# Altium footprint library PcbLib1.PcbLib: 1016 footprints (part 53 of 64)
Each footprint in its own frame and in the unit in brackets; x right, y up, seen from the top. Pads: shape width x height; smd on the part's side, far side on the other; paste and mask are expansions set on the pad; w line width, h text height; cw(c..) or ccw(c..) is an arc to the next point about the centre after c.
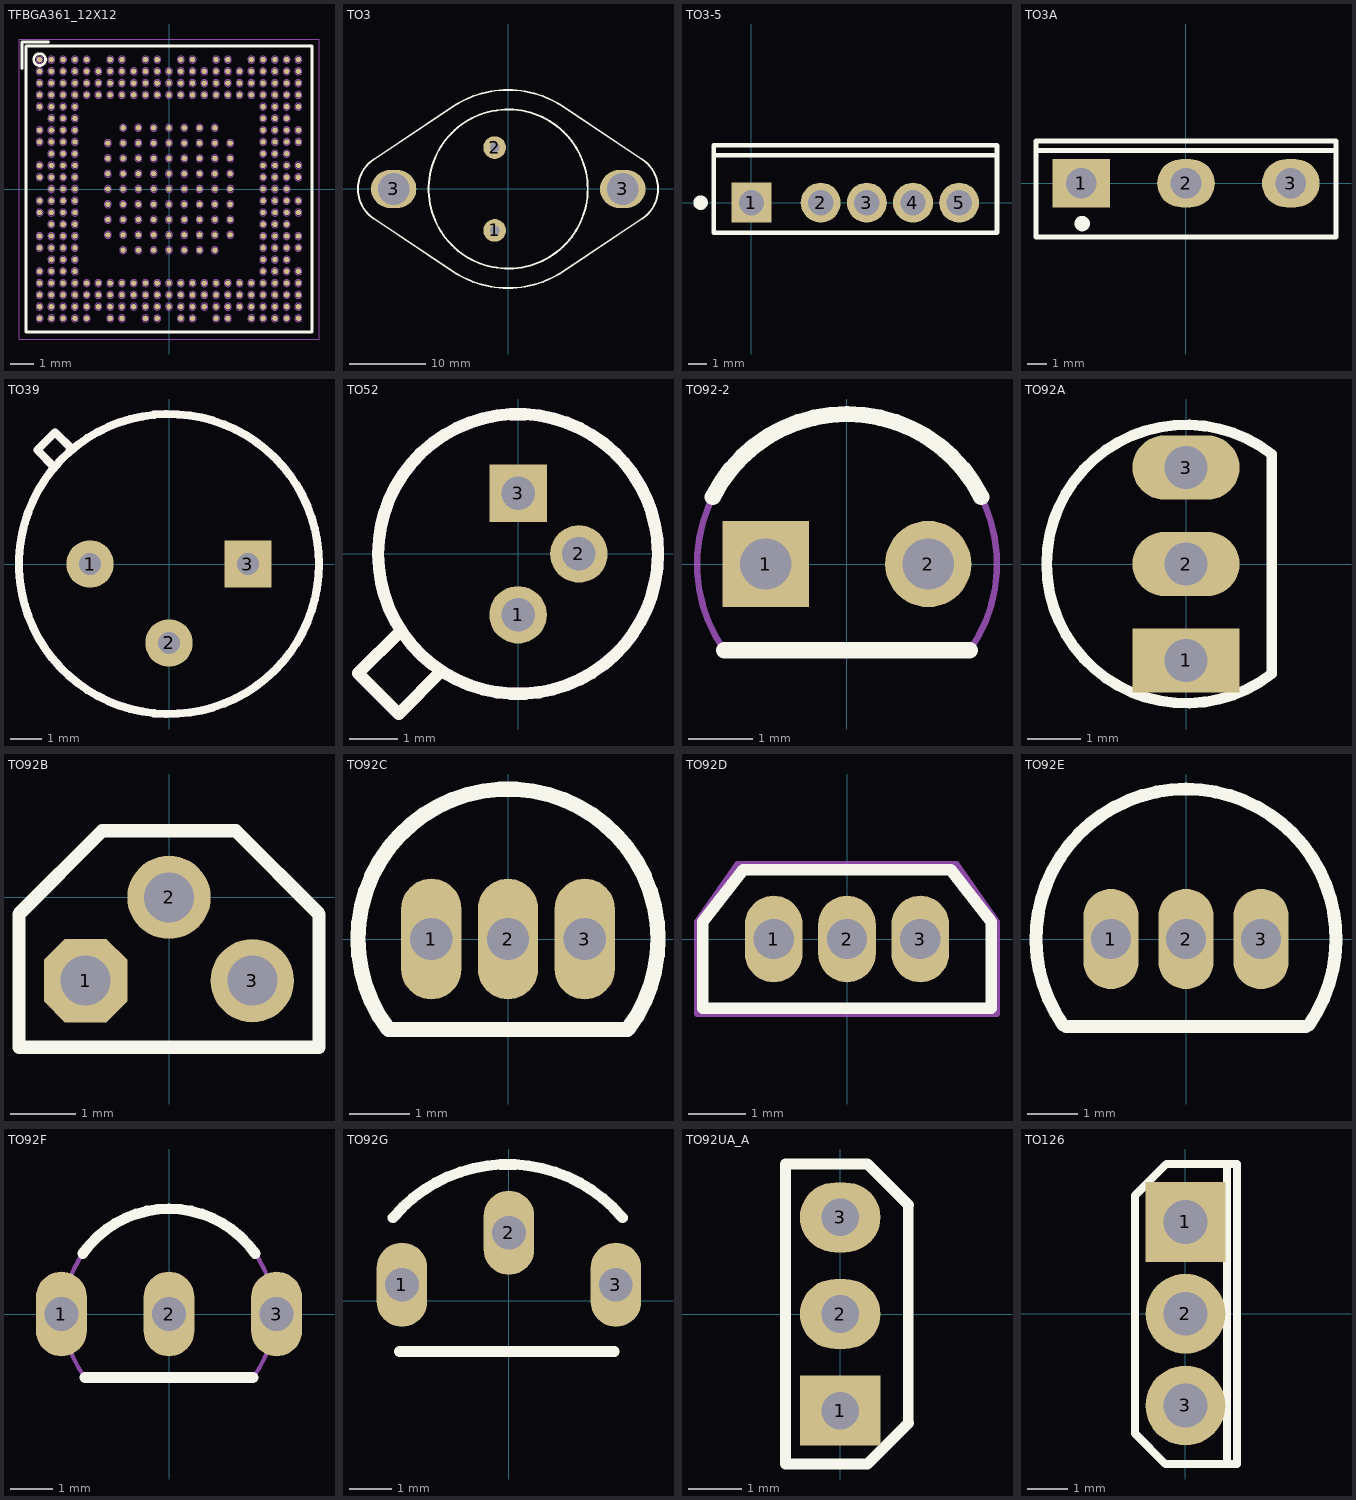
[diagram p52: the footprints below, top view; thin cyan lines are the x and y axes]

## TFBGA361_12X12 [mm]
pads (361):
  round 0.23 smd mask+0.05: 1A2(-1.95,2.6) 1A3(-1.3,2.6) 1A4(-0.65,2.6) 1A5(0,2.6) 1A6(0.65,2.6) 1A7(1.3,2.6) 1A8(1.95,2.6) 1B1(-2.6,1.95) 1B2(-1.95,1.95) 1B3(-1.3,1.95) 1B4(-0.65,1.95) 1B5(0,1.95) 1B6(0.65,1.95) 1B7(1.3,1.95) 1B8(1.95,1.95) 1B9(2.6,1.95) 1C1(-2.6,1.3) 1C2(-1.95,1.3) 1C3(-1.3,1.3) 1C4(-0.65,1.3) 1C5(0,1.3) 1C6(0.65,1.3) 1C7(1.3,1.3) 1C8(1.95,1.3) 1C9(2.6,1.3) 1D1(-2.6,0.65) 1D2(-1.95,0.65) 1D3(-1.3,0.65) 1D4(-0.65,0.65) 1D5(0,0.65) 1D6(0.65,0.65) 1D7(1.3,0.65) 1D8(1.95,0.65) 1D9(2.6,0.65) 1E1(-2.6,0) 1E2(-1.95,0) 1E3(-1.3,0) 1E4(-0.65,0) 1E5(0,0) 1E6(0.65,0) 1E7(1.3,0) 1E8(1.95,0) 1E9(2.6,0) 1F1(-2.6,-0.65) 1F2(-1.95,-0.65) 1F3(-1.3,-0.65) 1F4(-0.65,-0.65) 1F5(0,-0.65) 1F6(0.65,-0.65) 1F7(1.3,-0.65) 1F8(1.95,-0.65) 1F9(2.6,-0.65) 1G1(-2.6,-1.3) 1G2(-1.95,-1.3) 1G3(-1.3,-1.3) 1G4(-0.65,-1.3) 1G5(0,-1.3) 1G6(0.65,-1.3) 1G7(1.3,-1.3) 1G8(1.95,-1.3) 1G9(2.6,-1.3) 1H1(-2.6,-1.95) 1H2(-1.95,-1.95) 1H3(-1.3,-1.95) 1H4(-0.65,-1.95) 1H5(0,-1.95) 1H6(0.65,-1.95) 1H7(1.3,-1.95) 1H8(1.95,-1.95) 1H9(2.6,-1.95) 1J2(-1.95,-2.6) 1J3(-1.3,-2.6) 1J4(-0.65,-2.6) 1J5(0,-2.6) 1J6(0.65,-2.6) 1J7(1.3,-2.6) 1J8(1.95,-2.6) A1(-5.5,5.5) A2(-5,5.5) A3(-4.5,5.5) A4(-4,5.5) A5(-3.5,5.5) A7(-2.5,5.5) A8(-2,5.5) A10(-1,5.5) A11(-0.5,5.5) A13(0.5,5.5) A14(1,5.5) A16(2,5.5) A17(2.5,5.5) A19(3.5,5.5) A20(4,5.5) A21(4.5,5.5) A22(5,5.5) A23(5.5,5.5) AA1(-5.5,-4.5) AA2(-5,-4.5) AA3(-4.5,-4.5) AA4(-4,-4.5) AA5(-3.5,-4.5) AA6(-3,-4.5) AA7(-2.5,-4.5) AA8(-2,-4.5) AA9(-1.5,-4.5) AA10(-1,-4.5) AA11(-0.5,-4.5) AA12(0,-4.5) AA13(0.5,-4.5) AA14(1,-4.5) AA15(1.5,-4.5) AA16(2,-4.5) AA17(2.5,-4.5) AA18(3,-4.5) AA19(3.5,-4.5) AA20(4,-4.5) AA21(4.5,-4.5) AA22(5,-4.5) AA23(5.5,-4.5) AB1(-5.5,-5) AB2(-5,-5) AB3(-4.5,-5) AB4(-4,-5) AB5(-3.5,-5) AB6(-3,-5) AB7(-2.5,-5) AB8(-2,-5) AB9(-1.5,-5) AB10(-1,-5) AB11(-0.5,-5) AB12(0,-5) AB13(0.5,-5) AB14(1,-5) AB15(1.5,-5) AB16(2,-5) AB17(2.5,-5) AB18(3,-5) AB19(3.5,-5) AB20(4,-5) AB21(4.5,-5) AB22(5,-5) AB23(5.5,-5) AC1(-5.5,-5.5) AC2(-5,-5.5) AC3(-4.5,-5.5) AC4(-4,-5.5) AC5(-3.5,-5.5) AC7(-2.5,-5.5) AC8(-2,-5.5) AC10(-1,-5.5) AC11(-0.5,-5.5) AC13(0.5,-5.5) AC14(1,-5.5) AC16(2,-5.5) AC17(2.5,-5.5) AC19(3.5,-5.5) AC20(4,-5.5) AC21(4.5,-5.5) AC22(5,-5.5) AC23(5.5,-5.5) B1(-5.5,5) B2(-5,5) B3(-4.5,5) B4(-4,5) B5(-3.5,5) B6(-3,5) B7(-2.5,5) B8(-2,5) B9(-1.5,5) B10(-1,5) B11(-0.5,5) B12(0,5) B13(0.5,5) B14(1,5) B15(1.5,5) B16(2,5) B17(2.5,5) B18(3,5) B19(3.5,5) B20(4,5) B21(4.5,5) B22(5,5) B23(5.5,5) C1(-5.5,4.5) C2(-5,4.5) C3(-4.5,4.5) C4(-4,4.5) C5(-3.5,4.5) C6(-3,4.5) C7(-2.5,4.5) C8(-2,4.5) C9(-1.5,4.5) C10(-1,4.5) C11(-0.5,4.5) C12(0,4.5) C13(0.5,4.5) C14(1,4.5) C15(1.5,4.5) C16(2,4.5) C17(2.5,4.5) C18(3,4.5) C19(3.5,4.5) C20(4,4.5) C21(4.5,4.5) C22(5,4.5) C23(5.5,4.5) D1(-5.5,4) D2(-5,4) D3(-4.5,4) D4(-4,4) D5(-3.5,4) D6(-3,4) D7(-2.5,4) D8(-2,4) D9(-1.5,4) D10(-1,4) D11(-0.5,4) D12(0,4) D13(0.5,4) D14(1,4) D15(1.5,4) D16(2,4) D17(2.5,4) D18(3,4) D19(3.5,4) D20(4,4) D21(4.5,4) D22(5,4) D23(5.5,4) E1(-5.5,3.5) E2(-5,3.5) E3(-4.5,3.5) E4(-4,3.5) E20(4,3.5) E21(4.5,3.5) E22(5,3.5) E23(5.5,3.5) F2(-5,3) F3(-4.5,3) F4(-4,3) F20(4,3) F21(4.5,3) F22(5,3) G1(-5.5,2.5) G2(-5,2.5) G3(-4.5,2.5) G4(-4,2.5) G20(4,2.5) G21(4.5,2.5) G22(5,2.5) G23(5.5,2.5) H1(-5.5,2) H2(-5,2) H3(-4.5,2) H4(-4,2) H20(4,2) H21(4.5,2) H22(5,2) H23(5.5,2) J2(-5,1.5) J3(-4.5,1.5) J4(-4,1.5) J20(4,1.5) J21(4.5,1.5) J22(5,1.5) K1(-5.5,1) K2(-5,1) K3(-4.5,1) K4(-4,1) K20(4,1) K21(4.5,1) K22(5,1) K23(5.5,1) L1(-5.5,0.5) L2(-5,0.5) L3(-4.5,0.5) L4(-4,0.5) L20(4,0.5) L21(4.5,0.5) L22(5,0.5) L23(5.5,0.5) M2(-5,0) M3(-4.5,0) M4(-4,0) M20(4,0) M21(4.5,0) M22(5,0) N1(-5.5,-0.5) N2(-5,-0.5) N3(-4.5,-0.5) N4(-4,-0.5) N20(4,-0.5) N21(4.5,-0.5) N22(5,-0.5) N23(5.5,-0.5) P1(-5.5,-1) P2(-5,-1) P3(-4.5,-1) P4(-4,-1) P20(4,-1) P21(4.5,-1) P22(5,-1) P23(5.5,-1) R2(-5,-1.5) R3(-4.5,-1.5) R4(-4,-1.5) R20(4,-1.5) R21(4.5,-1.5) R22(5,-1.5) T1(-5.5,-2) T2(-5,-2) T3(-4.5,-2) T4(-4,-2) T20(4,-2) T21(4.5,-2) T22(5,-2) T23(5.5,-2) U1(-5.5,-2.5) U2(-5,-2.5) U3(-4.5,-2.5) U4(-4,-2.5) U20(4,-2.5) U21(4.5,-2.5) U22(5,-2.5) U23(5.5,-2.5) V2(-5,-3) V3(-4.5,-3) V4(-4,-3) V20(4,-3) V21(4.5,-3) V22(5,-3) W1(-5.5,-3.5) W2(-5,-3.5) W3(-4.5,-3.5) W4(-4,-3.5) W20(4,-3.5) W21(4.5,-3.5) W22(5,-3.5) W23(5.5,-3.5) Y1(-5.5,-4) Y2(-5,-4) Y3(-4.5,-4) Y4(-4,-4) Y5(-3.5,-4) Y6(-3,-4) Y7(-2.5,-4) Y8(-2,-4) Y9(-1.5,-4) Y10(-1,-4) Y11(-0.5,-4) Y12(0,-4) Y13(0.5,-4) Y14(1,-4) Y15(1.5,-4) Y16(2,-4) Y17(2.5,-4) Y18(3,-4) Y19(3.5,-4) Y20(4,-4) Y21(4.5,-4) Y22(5,-4) Y23(5.5,-4)
Top Overlay:
  circle w0.12: c-5.5,5.5 r0.251
  lines w0.12: -6.25,5.125 -6.25,6.25 -5.125,6.25 ; -6.075,-6.075 -6.075,6.075 6.075,6.075 6.075,-6.075 -6.075,-6.075
Mechanical 14:
  drawing of 365 lines, arcs and shapes, not listed
  text "A1" at -5.725,5.35 h0.5
Mechanical 16:
  lines w0.01: -6.375,-6.375 6.375,-6.375 6.375,6.375 5.9,6.375 -6.375,6.375 -6.375,-6.375
3D body: height 1.21, standoff 1.2, extent -5.798,5.201 -5.2,5.799
3D body: height 1.2, standoff 0.2, extent -6.075,-6.075 6.075,6.075
3D body: height 0.26, standoff -0.04, extent 3.852,3.359 4.148,3.65
3D body: height 0.26, standoff -0.04, extent 3.852,2.859 4.148,3.15
3D body: height 0.26, standoff -0.04, extent 3.852,2.359 4.148,2.65
3D body: height 0.26, standoff -0.04, extent 3.852,1.859 4.148,2.15
3D body: height 0.26, standoff -0.04, extent 3.852,1.359 4.148,1.65
3D body: height 0.26, standoff -0.04, extent 3.852,0.859 4.148,1.15
3D body: height 0.26, standoff -0.04, extent 3.852,0.359 4.148,0.65
3D body: height 0.26, standoff -0.04, extent 3.852,-0.141 4.148,0.15
3D body: height 0.26, standoff -0.04, extent 3.852,-0.641 4.148,-0.35
3D body: height 0.26, standoff -0.04, extent 3.852,-1.141 4.148,-0.85
3D body: height 0.26, standoff -0.04, extent 3.852,-1.641 4.148,-1.35
3D body: height 0.26, standoff -0.04, extent 3.852,-2.141 4.148,-1.85
3D body: height 0.26, standoff -0.04, extent 3.852,-2.641 4.148,-2.35
3D body: height 0.26, standoff -0.04, extent 3.852,-3.141 4.148,-2.85
3D body: height 0.26, standoff -0.04, extent 3.852,-3.641 4.148,-3.35
3D body: height 0.26, standoff -0.04, extent 4.352,3.359 4.648,3.65
3D body: height 0.26, standoff -0.04, extent 4.352,2.859 4.648,3.15
3D body: height 0.26, standoff -0.04, extent 4.352,2.359 4.648,2.65
3D body: height 0.26, standoff -0.04, extent 4.352,1.859 4.648,2.15
3D body: height 0.26, standoff -0.04, extent 4.352,1.359 4.648,1.65
3D body: height 0.26, standoff -0.04, extent 4.352,0.859 4.648,1.15
3D body: height 0.26, standoff -0.04, extent 4.352,0.359 4.648,0.65
3D body: height 0.26, standoff -0.04, extent 4.352,-0.141 4.648,0.15
3D body: height 0.26, standoff -0.04, extent 4.352,-0.641 4.648,-0.35
3D body: height 0.26, standoff -0.04, extent 4.352,-1.141 4.648,-0.85
3D body: height 0.26, standoff -0.04, extent 4.352,-1.641 4.648,-1.35
3D body: height 0.26, standoff -0.04, extent 4.352,-2.141 4.648,-1.85
3D body: height 0.26, standoff -0.04, extent 4.352,-2.641 4.648,-2.35
3D body: height 0.26, standoff -0.04, extent 4.352,-3.141 4.648,-2.85
3D body: height 0.26, standoff -0.04, extent 4.352,-3.641 4.648,-3.35
3D body: height 0.26, standoff -0.04, extent 4.852,3.359 5.148,3.65
3D body: height 0.26, standoff -0.04, extent 4.852,2.859 5.148,3.15
3D body: height 0.26, standoff -0.04, extent 4.852,2.359 5.148,2.65
3D body: height 0.26, standoff -0.04, extent 4.852,1.859 5.148,2.15
3D body: height 0.26, standoff -0.04, extent 4.852,1.359 5.148,1.65
3D body: height 0.26, standoff -0.04, extent 4.852,0.859 5.148,1.15
3D body: height 0.26, standoff -0.04, extent 4.852,0.359 5.148,0.65
3D body: height 0.26, standoff -0.04, extent 4.852,-0.141 5.148,0.15
3D body: height 0.26, standoff -0.04, extent 4.852,-0.641 5.148,-0.35
3D body: height 0.26, standoff -0.04, extent 4.852,-1.141 5.148,-0.85
3D body: height 0.26, standoff -0.04, extent 4.852,-1.641 5.148,-1.35
3D body: height 0.26, standoff -0.04, extent 4.852,-2.141 5.148,-1.85
3D body: height 0.26, standoff -0.04, extent 4.852,-2.641 5.148,-2.35
3D body: height 0.26, standoff -0.04, extent 4.852,-3.141 5.148,-2.85
3D body: height 0.26, standoff -0.04, extent 4.852,-3.641 5.148,-3.35
3D body: height 0.26, standoff -0.04, extent 5.352,3.359 5.648,3.65
3D body: height 0.26, standoff -0.04, extent 5.352,2.359 5.648,2.65
3D body: height 0.26, standoff -0.04, extent 5.352,1.859 5.648,2.15
3D body: height 0.26, standoff -0.04, extent 5.352,0.859 5.648,1.15
3D body: height 0.26, standoff -0.04, extent 5.352,0.359 5.648,0.65
3D body: height 0.26, standoff -0.04, extent 5.352,-0.641 5.648,-0.35
3D body: height 0.26, standoff -0.04, extent 5.352,-1.141 5.648,-0.85
3D body: height 0.26, standoff -0.04, extent 5.352,-2.141 5.648,-1.85
3D body: height 0.26, standoff -0.04, extent 5.352,-2.641 5.648,-2.35
3D body: height 0.26, standoff -0.04, extent 5.352,-3.641 5.648,-3.35
3D body: height 0.26, standoff -0.04, extent -4.148,3.359 -3.852,3.65
3D body: height 0.26, standoff -0.04, extent -4.148,2.859 -3.852,3.15
3D body: height 0.26, standoff -0.04, extent -4.148,2.359 -3.852,2.65
3D body: height 0.26, standoff -0.04, extent -4.148,1.859 -3.852,2.15
3D body: height 0.26, standoff -0.04, extent -4.148,1.359 -3.852,1.65
3D body: height 0.26, standoff -0.04, extent -4.148,0.859 -3.852,1.15
3D body: height 0.26, standoff -0.04, extent -4.148,0.359 -3.852,0.65
3D body: height 0.26, standoff -0.04, extent -4.148,-0.141 -3.852,0.15
3D body: height 0.26, standoff -0.04, extent -4.148,-0.641 -3.852,-0.35
3D body: height 0.26, standoff -0.04, extent -4.148,-1.141 -3.852,-0.85
3D body: height 0.26, standoff -0.04, extent -4.148,-1.641 -3.852,-1.35
3D body: height 0.26, standoff -0.04, extent -4.148,-2.141 -3.852,-1.85
3D body: height 0.26, standoff -0.04, extent -4.148,-2.641 -3.852,-2.35
3D body: height 0.26, standoff -0.04, extent -4.148,-3.141 -3.852,-2.85
3D body: height 0.26, standoff -0.04, extent -4.148,-3.641 -3.852,-3.35
3D body: height 0.26, standoff -0.04, extent -4.648,3.359 -4.352,3.65
3D body: height 0.26, standoff -0.04, extent -4.648,2.859 -4.352,3.15
3D body: height 0.26, standoff -0.04, extent -4.648,2.359 -4.352,2.65
3D body: height 0.26, standoff -0.04, extent -4.648,1.859 -4.352,2.15
3D body: height 0.26, standoff -0.04, extent -4.648,1.359 -4.352,1.65
3D body: height 0.26, standoff -0.04, extent -4.648,0.859 -4.352,1.15
3D body: height 0.26, standoff -0.04, extent -4.648,0.359 -4.352,0.65
3D body: height 0.26, standoff -0.04, extent -4.648,-0.141 -4.352,0.15
3D body: height 0.26, standoff -0.04, extent -4.648,-0.641 -4.352,-0.35
3D body: height 0.26, standoff -0.04, extent -4.648,-1.141 -4.352,-0.85
3D body: height 0.26, standoff -0.04, extent -4.648,-1.641 -4.352,-1.35
3D body: height 0.26, standoff -0.04, extent -4.648,-2.141 -4.352,-1.85
3D body: height 0.26, standoff -0.04, extent -4.648,-2.641 -4.352,-2.35
3D body: height 0.26, standoff -0.04, extent -4.648,-3.141 -4.352,-2.85
3D body: height 0.26, standoff -0.04, extent -4.648,-3.641 -4.352,-3.35
3D body: height 0.26, standoff -0.04, extent -5.148,3.359 -4.852,3.65
3D body: height 0.26, standoff -0.04, extent -5.148,2.859 -4.852,3.15
3D body: height 0.26, standoff -0.04, extent -5.148,2.359 -4.852,2.65
3D body: height 0.26, standoff -0.04, extent -5.148,1.859 -4.852,2.15
3D body: height 0.26, standoff -0.04, extent -5.148,1.359 -4.852,1.65
3D body: height 0.26, standoff -0.04, extent -5.148,0.859 -4.852,1.15
3D body: height 0.26, standoff -0.04, extent -5.148,0.359 -4.852,0.65
3D body: height 0.26, standoff -0.04, extent -5.148,-0.141 -4.852,0.15
3D body: height 0.26, standoff -0.04, extent -5.148,-0.641 -4.852,-0.35
3D body: height 0.26, standoff -0.04, extent -5.148,-1.141 -4.852,-0.85
3D body: height 0.26, standoff -0.04, extent -5.148,-1.641 -4.852,-1.35
3D body: height 0.26, standoff -0.04, extent -5.148,-2.141 -4.852,-1.85
3D body: height 0.26, standoff -0.04, extent -5.148,-2.641 -4.852,-2.35
3D body: height 0.26, standoff -0.04, extent -5.148,-3.141 -4.852,-2.85
3D body: height 0.26, standoff -0.04, extent -5.148,-3.641 -4.852,-3.35
3D body: height 0.26, standoff -0.04, extent -5.648,-3.641 -5.352,-3.35
3D body: height 0.26, standoff -0.04, extent -5.648,-2.641 -5.352,-2.35
3D body: height 0.26, standoff -0.04, extent -5.648,-2.141 -5.352,-1.85
3D body: height 0.26, standoff -0.04, extent -5.648,-1.141 -5.352,-0.85
3D body: height 0.26, standoff -0.04, extent -5.648,-0.641 -5.352,-0.35
3D body: height 0.26, standoff -0.04, extent -5.648,0.359 -5.352,0.65
3D body: height 0.26, standoff -0.04, extent -5.648,0.859 -5.352,1.15
3D body: height 0.26, standoff -0.04, extent -5.648,1.859 -5.352,2.15
3D body: height 0.26, standoff -0.04, extent -5.648,2.359 -5.352,2.65
3D body: height 0.26, standoff -0.04, extent -5.648,3.359 -5.352,3.65
3D body: height 0.26, standoff -0.04, extent -5.641,-5.648 -5.35,-5.352
3D body: height 0.26, standoff -0.04, extent -5.141,-5.648 -4.85,-5.352
3D body: height 0.26, standoff -0.04, extent -4.641,-5.648 -4.35,-5.352
3D body: height 0.26, standoff -0.04, extent -4.141,-5.648 -3.85,-5.352
3D body: height 0.26, standoff -0.04, extent -3.641,-5.648 -3.35,-5.352
3D body: height 0.26, standoff -0.04, extent -2.641,-5.648 -2.35,-5.352
3D body: height 0.26, standoff -0.04, extent -2.141,-5.648 -1.85,-5.352
3D body: height 0.26, standoff -0.04, extent -1.141,-5.648 -0.85,-5.352
3D body: height 0.26, standoff -0.04, extent -0.641,-5.648 -0.35,-5.352
3D body: height 0.26, standoff -0.04, extent 0.359,-5.648 0.65,-5.352
3D body: height 0.26, standoff -0.04, extent 0.859,-5.648 1.15,-5.352
3D body: height 0.26, standoff -0.04, extent 1.859,-5.648 2.15,-5.352
3D body: height 0.26, standoff -0.04, extent 2.359,-5.648 2.65,-5.352
3D body: height 0.26, standoff -0.04, extent 3.359,-5.648 3.65,-5.352
3D body: height 0.26, standoff -0.04, extent 3.859,-5.648 4.15,-5.352
3D body: height 0.26, standoff -0.04, extent 4.359,-5.648 4.65,-5.352
3D body: height 0.26, standoff -0.04, extent 4.859,-5.648 5.15,-5.352
3D body: height 0.26, standoff -0.04, extent 5.359,-5.648 5.65,-5.352
3D body: height 0.26, standoff -0.04, extent -5.641,-5.148 -5.35,-4.852
3D body: height 0.26, standoff -0.04, extent -5.141,-5.148 -4.85,-4.852
3D body: height 0.26, standoff -0.04, extent -4.641,-5.148 -4.35,-4.852
3D body: height 0.26, standoff -0.04, extent -4.141,-5.148 -3.85,-4.852
3D body: height 0.26, standoff -0.04, extent -3.641,-5.148 -3.35,-4.852
3D body: height 0.26, standoff -0.04, extent -3.141,-5.148 -2.85,-4.852
3D body: height 0.26, standoff -0.04, extent -2.641,-5.148 -2.35,-4.852
3D body: height 0.26, standoff -0.04, extent -2.141,-5.148 -1.85,-4.852
3D body: height 0.26, standoff -0.04, extent -1.641,-5.148 -1.35,-4.852
3D body: height 0.26, standoff -0.04, extent -1.141,-5.148 -0.85,-4.852
3D body: height 0.26, standoff -0.04, extent -0.641,-5.148 -0.35,-4.852
3D body: height 0.26, standoff -0.04, extent -0.141,-5.148 0.15,-4.852
3D body: height 0.26, standoff -0.04, extent 0.359,-5.148 0.65,-4.852
3D body: height 0.26, standoff -0.04, extent 0.859,-5.148 1.15,-4.852
3D body: height 0.26, standoff -0.04, extent 1.359,-5.148 1.65,-4.852
3D body: height 0.26, standoff -0.04, extent 1.859,-5.148 2.15,-4.852
3D body: height 0.26, standoff -0.04, extent 2.359,-5.148 2.65,-4.852
3D body: height 0.26, standoff -0.04, extent 2.859,-5.148 3.15,-4.852
3D body: height 0.26, standoff -0.04, extent 3.359,-5.148 3.65,-4.852
3D body: height 0.26, standoff -0.04, extent 3.859,-5.148 4.15,-4.852
3D body: height 0.26, standoff -0.04, extent 4.359,-5.148 4.65,-4.852
3D body: height 0.26, standoff -0.04, extent 4.859,-5.148 5.15,-4.852
3D body: height 0.26, standoff -0.04, extent 5.359,-5.148 5.65,-4.852
3D body: height 0.26, standoff -0.04, extent -5.641,-4.648 -5.35,-4.352
3D body: height 0.26, standoff -0.04, extent -5.141,-4.648 -4.85,-4.352
3D body: height 0.26, standoff -0.04, extent -4.641,-4.648 -4.35,-4.352
3D body: height 0.26, standoff -0.04, extent -4.141,-4.648 -3.85,-4.352
3D body: height 0.26, standoff -0.04, extent -3.641,-4.648 -3.35,-4.352
3D body: height 0.26, standoff -0.04, extent -3.141,-4.648 -2.85,-4.352
3D body: height 0.26, standoff -0.04, extent -2.641,-4.648 -2.35,-4.352
3D body: height 0.26, standoff -0.04, extent -2.141,-4.648 -1.85,-4.352
3D body: height 0.26, standoff -0.04, extent -1.641,-4.648 -1.35,-4.352
3D body: height 0.26, standoff -0.04, extent -1.141,-4.648 -0.85,-4.352
3D body: height 0.26, standoff -0.04, extent -0.641,-4.648 -0.35,-4.352
3D body: height 0.26, standoff -0.04, extent -0.141,-4.648 0.15,-4.352
3D body: height 0.26, standoff -0.04, extent 0.359,-4.648 0.65,-4.352
3D body: height 0.26, standoff -0.04, extent 0.859,-4.648 1.15,-4.352
3D body: height 0.26, standoff -0.04, extent 1.359,-4.648 1.65,-4.352
3D body: height 0.26, standoff -0.04, extent 1.859,-4.648 2.15,-4.352
3D body: height 0.26, standoff -0.04, extent 2.359,-4.648 2.65,-4.352
3D body: height 0.26, standoff -0.04, extent 2.859,-4.648 3.15,-4.352
3D body: height 0.26, standoff -0.04, extent 3.359,-4.648 3.65,-4.352
3D body: height 0.26, standoff -0.04, extent 3.859,-4.648 4.15,-4.352
3D body: height 0.26, standoff -0.04, extent 4.359,-4.648 4.65,-4.352
3D body: height 0.26, standoff -0.04, extent 4.859,-4.648 5.15,-4.352
3D body: height 0.26, standoff -0.04, extent 5.359,-4.648 5.65,-4.352
3D body: height 0.26, standoff -0.04, extent -5.641,-4.148 -5.35,-3.852
3D body: height 0.26, standoff -0.04, extent -5.141,-4.148 -4.85,-3.852
3D body: height 0.26, standoff -0.04, extent -4.641,-4.148 -4.35,-3.852
3D body: height 0.26, standoff -0.04, extent -4.141,-4.148 -3.85,-3.852
3D body: height 0.26, standoff -0.04, extent -3.641,-4.148 -3.35,-3.852
3D body: height 0.26, standoff -0.04, extent -3.141,-4.148 -2.85,-3.852
3D body: height 0.26, standoff -0.04, extent -2.641,-4.148 -2.35,-3.852
3D body: height 0.26, standoff -0.04, extent -2.141,-4.148 -1.85,-3.852
3D body: height 0.26, standoff -0.04, extent -1.641,-4.148 -1.35,-3.852
3D body: height 0.26, standoff -0.04, extent -1.141,-4.148 -0.85,-3.852
3D body: height 0.26, standoff -0.04, extent -0.641,-4.148 -0.35,-3.852
3D body: height 0.26, standoff -0.04, extent -0.141,-4.148 0.15,-3.852
3D body: height 0.26, standoff -0.04, extent 0.359,-4.148 0.65,-3.852
3D body: height 0.26, standoff -0.04, extent 0.859,-4.148 1.15,-3.852
3D body: height 0.26, standoff -0.04, extent 1.359,-4.148 1.65,-3.852
3D body: height 0.26, standoff -0.04, extent 1.859,-4.148 2.15,-3.852
3D body: height 0.26, standoff -0.04, extent 2.359,-4.148 2.65,-3.852
3D body: height 0.26, standoff -0.04, extent 2.859,-4.148 3.15,-3.852
3D body: height 0.26, standoff -0.04, extent 3.359,-4.148 3.65,-3.852
3D body: height 0.26, standoff -0.04, extent 3.859,-4.148 4.15,-3.852
3D body: height 0.26, standoff -0.04, extent 4.359,-4.148 4.65,-3.852
3D body: height 0.26, standoff -0.04, extent 4.859,-4.148 5.15,-3.852
3D body: height 0.26, standoff -0.04, extent 5.359,-4.148 5.65,-3.852
3D body: height 0.26, standoff -0.04, extent -5.641,3.852 -5.35,4.148
3D body: height 0.26, standoff -0.04, extent -5.141,3.852 -4.85,4.148
3D body: height 0.26, standoff -0.04, extent -4.641,3.852 -4.35,4.148
3D body: height 0.26, standoff -0.04, extent -4.141,3.852 -3.85,4.148
3D body: height 0.26, standoff -0.04, extent -3.641,3.852 -3.35,4.148
3D body: height 0.26, standoff -0.04, extent -3.141,3.852 -2.85,4.148
3D body: height 0.26, standoff -0.04, extent -2.641,3.852 -2.35,4.148
3D body: height 0.26, standoff -0.04, extent -2.141,3.852 -1.85,4.148
3D body: height 0.26, standoff -0.04, extent -1.641,3.852 -1.35,4.148
3D body: height 0.26, standoff -0.04, extent -1.141,3.852 -0.85,4.148
3D body: height 0.26, standoff -0.04, extent -0.641,3.852 -0.35,4.148
3D body: height 0.26, standoff -0.04, extent -0.141,3.852 0.15,4.148
3D body: height 0.26, standoff -0.04, extent 0.359,3.852 0.65,4.148
3D body: height 0.26, standoff -0.04, extent 0.859,3.852 1.15,4.148
3D body: height 0.26, standoff -0.04, extent 1.359,3.852 1.65,4.148
3D body: height 0.26, standoff -0.04, extent 1.859,3.852 2.15,4.148
3D body: height 0.26, standoff -0.04, extent 2.359,3.852 2.65,4.148
3D body: height 0.26, standoff -0.04, extent 2.859,3.852 3.15,4.148
3D body: height 0.26, standoff -0.04, extent 3.359,3.852 3.65,4.148
3D body: height 0.26, standoff -0.04, extent 3.859,3.852 4.15,4.148
3D body: height 0.26, standoff -0.04, extent 4.359,3.852 4.65,4.148
3D body: height 0.26, standoff -0.04, extent 4.859,3.852 5.15,4.148
3D body: height 0.26, standoff -0.04, extent 5.359,3.852 5.65,4.148
3D body: height 0.26, standoff -0.04, extent -5.641,4.352 -5.35,4.648
3D body: height 0.26, standoff -0.04, extent -5.141,4.352 -4.85,4.648
3D body: height 0.26, standoff -0.04, extent -4.641,4.352 -4.35,4.648
3D body: height 0.26, standoff -0.04, extent -4.141,4.352 -3.85,4.648
3D body: height 0.26, standoff -0.04, extent -3.641,4.352 -3.35,4.648
3D body: height 0.26, standoff -0.04, extent -3.141,4.352 -2.85,4.648
3D body: height 0.26, standoff -0.04, extent -2.641,4.352 -2.35,4.648
3D body: height 0.26, standoff -0.04, extent -2.141,4.352 -1.85,4.648
3D body: height 0.26, standoff -0.04, extent -1.641,4.352 -1.35,4.648
3D body: height 0.26, standoff -0.04, extent -1.141,4.352 -0.85,4.648
3D body: height 0.26, standoff -0.04, extent -0.641,4.352 -0.35,4.648
3D body: height 0.26, standoff -0.04, extent -0.141,4.352 0.15,4.648
3D body: height 0.26, standoff -0.04, extent 0.359,4.352 0.65,4.648
3D body: height 0.26, standoff -0.04, extent 0.859,4.352 1.15,4.648
3D body: height 0.26, standoff -0.04, extent 1.359,4.352 1.65,4.648
3D body: height 0.26, standoff -0.04, extent 1.859,4.352 2.15,4.648
3D body: height 0.26, standoff -0.04, extent 2.359,4.352 2.65,4.648
3D body: height 0.26, standoff -0.04, extent 2.859,4.352 3.15,4.648
3D body: height 0.26, standoff -0.04, extent 3.359,4.352 3.65,4.648
3D body: height 0.26, standoff -0.04, extent 3.859,4.352 4.15,4.648
3D body: height 0.26, standoff -0.04, extent 4.359,4.352 4.65,4.648
3D body: height 0.26, standoff -0.04, extent 4.859,4.352 5.15,4.648
3D body: height 0.26, standoff -0.04, extent 5.359,4.352 5.65,4.648
3D body: height 0.26, standoff -0.04, extent -5.641,4.852 -5.35,5.148
3D body: height 0.26, standoff -0.04, extent -5.141,4.852 -4.85,5.148
3D body: height 0.26, standoff -0.04, extent -4.641,4.852 -4.35,5.148
3D body: height 0.26, standoff -0.04, extent -4.141,4.852 -3.85,5.148
3D body: height 0.26, standoff -0.04, extent -3.641,4.852 -3.35,5.148
3D body: height 0.26, standoff -0.04, extent -3.141,4.852 -2.85,5.148
3D body: height 0.26, standoff -0.04, extent -2.641,4.852 -2.35,5.148
3D body: height 0.26, standoff -0.04, extent -2.141,4.852 -1.85,5.148
3D body: height 0.26, standoff -0.04, extent -1.641,4.852 -1.35,5.148
3D body: height 0.26, standoff -0.04, extent -1.141,4.852 -0.85,5.148
3D body: height 0.26, standoff -0.04, extent -0.641,4.852 -0.35,5.148
3D body: height 0.26, standoff -0.04, extent -0.141,4.852 0.15,5.148
3D body: height 0.26, standoff -0.04, extent 0.359,4.852 0.65,5.148
3D body: height 0.26, standoff -0.04, extent 0.859,4.852 1.15,5.148
3D body: height 0.26, standoff -0.04, extent 1.359,4.852 1.65,5.148
3D body: height 0.26, standoff -0.04, extent 1.859,4.852 2.15,5.148
3D body: height 0.26, standoff -0.04, extent 2.359,4.852 2.65,5.148
3D body: height 0.26, standoff -0.04, extent 2.859,4.852 3.15,5.148
3D body: height 0.26, standoff -0.04, extent 3.359,4.852 3.65,5.148
3D body: height 0.26, standoff -0.04, extent 3.859,4.852 4.15,5.148
3D body: height 0.26, standoff -0.04, extent 4.359,4.852 4.65,5.148
3D body: height 0.26, standoff -0.04, extent 4.859,4.852 5.15,5.148
3D body: height 0.26, standoff -0.04, extent 5.359,4.852 5.65,5.148
3D body: height 0.26, standoff -0.04, extent 5.359,5.352 5.65,5.648
3D body: height 0.26, standoff -0.04, extent 4.859,5.352 5.15,5.648
3D body: height 0.26, standoff -0.04, extent 4.359,5.352 4.65,5.648
3D body: height 0.26, standoff -0.04, extent 3.859,5.352 4.15,5.648
3D body: height 0.26, standoff -0.04, extent 3.359,5.352 3.65,5.648
3D body: height 0.26, standoff -0.04, extent 2.359,5.352 2.65,5.648
3D body: height 0.26, standoff -0.04, extent 1.859,5.352 2.15,5.648
3D body: height 0.26, standoff -0.04, extent 0.859,5.352 1.15,5.648
3D body: height 0.26, standoff -0.04, extent 0.359,5.352 0.65,5.648
3D body: height 0.26, standoff -0.04, extent -0.641,5.352 -0.35,5.648
3D body: height 0.26, standoff -0.04, extent -1.141,5.352 -0.85,5.648
3D body: height 0.26, standoff -0.04, extent -2.141,5.352 -1.85,5.648
3D body: height 0.26, standoff -0.04, extent -2.641,5.352 -2.35,5.648
3D body: height 0.26, standoff -0.04, extent -3.641,5.352 -3.35,5.648
3D body: height 0.26, standoff -0.04, extent -4.141,5.352 -3.85,5.648
3D body: height 0.26, standoff -0.04, extent -4.641,5.352 -4.35,5.648
3D body: height 0.26, standoff -0.04, extent -5.141,5.352 -4.85,5.648
3D body: height 0.26, standoff -0.04, extent -5.641,5.352 -5.35,5.648
3D body: height 0.26, standoff -0.04, extent -0.141,-2.748 0.15,-2.452
3D body: height 0.26, standoff -0.04, extent -2.091,-2.748 -1.8,-2.452
3D body: height 0.26, standoff -0.04, extent -1.441,-2.748 -1.15,-2.452
3D body: height 0.26, standoff -0.04, extent -0.791,-2.748 -0.5,-2.452
3D body: height 0.26, standoff -0.04, extent 0.509,-2.748 0.8,-2.452
3D body: height 0.26, standoff -0.04, extent 1.159,-2.748 1.45,-2.452
3D body: height 0.26, standoff -0.04, extent 1.809,-2.748 2.1,-2.452
3D body: height 0.26, standoff -0.04, extent -0.141,-2.098 0.15,-1.802
3D body: height 0.26, standoff -0.04, extent -2.741,-2.098 -2.45,-1.802
3D body: height 0.26, standoff -0.04, extent -2.091,-2.098 -1.8,-1.802
3D body: height 0.26, standoff -0.04, extent -1.441,-2.098 -1.15,-1.802
3D body: height 0.26, standoff -0.04, extent -0.791,-2.098 -0.5,-1.802
3D body: height 0.26, standoff -0.04, extent 0.509,-2.098 0.8,-1.802
3D body: height 0.26, standoff -0.04, extent 1.159,-2.098 1.45,-1.802
3D body: height 0.26, standoff -0.04, extent 1.809,-2.098 2.1,-1.802
3D body: height 0.26, standoff -0.04, extent 2.459,-2.098 2.75,-1.802
3D body: height 0.26, standoff -0.04, extent -0.141,-1.448 0.15,-1.152
3D body: height 0.26, standoff -0.04, extent -2.741,-1.448 -2.45,-1.152
3D body: height 0.26, standoff -0.04, extent -2.091,-1.448 -1.8,-1.152
3D body: height 0.26, standoff -0.04, extent -1.441,-1.448 -1.15,-1.152
3D body: height 0.26, standoff -0.04, extent -0.791,-1.448 -0.5,-1.152
3D body: height 0.26, standoff -0.04, extent 0.509,-1.448 0.8,-1.152
3D body: height 0.26, standoff -0.04, extent 1.159,-1.448 1.45,-1.152
3D body: height 0.26, standoff -0.04, extent 1.809,-1.448 2.1,-1.152
3D body: height 0.26, standoff -0.04, extent 2.459,-1.448 2.75,-1.152
3D body: height 0.26, standoff -0.04, extent -0.141,-0.798 0.15,-0.502
3D body: height 0.26, standoff -0.04, extent -2.741,-0.798 -2.45,-0.502
3D body: height 0.26, standoff -0.04, extent -2.091,-0.798 -1.8,-0.502
3D body: height 0.26, standoff -0.04, extent -1.441,-0.798 -1.15,-0.502
3D body: height 0.26, standoff -0.04, extent -0.791,-0.798 -0.5,-0.502
3D body: height 0.26, standoff -0.04, extent 0.509,-0.798 0.8,-0.502
3D body: height 0.26, standoff -0.04, extent 1.159,-0.798 1.45,-0.502
3D body: height 0.26, standoff -0.04, extent 1.809,-0.798 2.1,-0.502
3D body: height 0.26, standoff -0.04, extent 2.459,-0.798 2.75,-0.502
3D body: height 0.26, standoff -0.04, extent -0.141,2.452 0.15,2.748
3D body: height 0.26, standoff -0.04, extent -2.091,2.452 -1.8,2.748
3D body: height 0.26, standoff -0.04, extent -1.441,2.452 -1.15,2.748
3D body: height 0.26, standoff -0.04, extent -0.791,2.452 -0.5,2.748
3D body: height 0.26, standoff -0.04, extent 0.509,2.452 0.8,2.748
3D body: height 0.26, standoff -0.04, extent 1.159,2.452 1.45,2.748
3D body: height 0.26, standoff -0.04, extent 1.809,2.452 2.1,2.748
3D body: height 0.26, standoff -0.04, extent -0.141,1.802 0.15,2.098
3D body: height 0.26, standoff -0.04, extent -2.741,1.802 -2.45,2.098
3D body: height 0.26, standoff -0.04, extent -2.091,1.802 -1.8,2.098
3D body: height 0.26, standoff -0.04, extent -1.441,1.802 -1.15,2.098
3D body: height 0.26, standoff -0.04, extent -0.791,1.802 -0.5,2.098
3D body: height 0.26, standoff -0.04, extent 0.509,1.802 0.8,2.098
3D body: height 0.26, standoff -0.04, extent 1.159,1.802 1.45,2.098
3D body: height 0.26, standoff -0.04, extent 1.809,1.802 2.1,2.098
3D body: height 0.26, standoff -0.04, extent 2.459,1.802 2.75,2.098
3D body: height 0.26, standoff -0.04, extent -0.141,1.152 0.15,1.448
3D body: height 0.26, standoff -0.04, extent -2.741,1.152 -2.45,1.448
3D body: height 0.26, standoff -0.04, extent -2.091,1.152 -1.8,1.448
3D body: height 0.26, standoff -0.04, extent -1.441,1.152 -1.15,1.448
3D body: height 0.26, standoff -0.04, extent -0.791,1.152 -0.5,1.448
3D body: height 0.26, standoff -0.04, extent 0.509,1.152 0.8,1.448
3D body: height 0.26, standoff -0.04, extent 1.159,1.152 1.45,1.448
3D body: height 0.26, standoff -0.04, extent 1.809,1.152 2.1,1.448
3D body: height 0.26, standoff -0.04, extent 2.459,1.152 2.75,1.448
3D body: height 0.26, standoff -0.04, extent -0.141,0.502 0.15,0.798
3D body: height 0.26, standoff -0.04, extent -2.741,0.502 -2.45,0.798
3D body: height 0.26, standoff -0.04, extent -2.091,0.502 -1.8,0.798
3D body: height 0.26, standoff -0.04, extent -1.441,0.502 -1.15,0.798
3D body: height 0.26, standoff -0.04, extent -0.791,0.502 -0.5,0.798
3D body: height 0.26, standoff -0.04, extent 0.509,0.502 0.8,0.798
3D body: height 0.26, standoff -0.04, extent 1.159,0.502 1.45,0.798
3D body: height 0.26, standoff -0.04, extent 1.809,0.502 2.1,0.798
3D body: height 0.26, standoff -0.04, extent 2.459,0.502 2.75,0.798
3D body: height 0.26, standoff -0.04, extent 2.459,-0.148 2.75,0.148
3D body: height 0.26, standoff -0.04, extent 1.809,-0.148 2.1,0.148
3D body: height 0.26, standoff -0.04, extent 1.159,-0.148 1.45,0.148
3D body: height 0.26, standoff -0.04, extent 0.509,-0.148 0.8,0.148
3D body: height 0.26, standoff -0.04, extent -0.791,-0.148 -0.5,0.148
3D body: height 0.26, standoff -0.04, extent -1.441,-0.148 -1.15,0.148
3D body: height 0.26, standoff -0.04, extent -2.091,-0.148 -1.8,0.148
3D body: height 0.26, standoff -0.04, extent -2.741,-0.148 -2.45,0.148
3D body: height 0.26, standoff -0.04, extent -0.141,-0.148 0.15,0.148

## TO3 [mm]
pads (4):
  round 3 hole 1.3: 1(-1.778,-5.461) 2(-1.778,5.461)
  oval 6x5 hole 4.2: 3(-15.113,0) 3(15.113,0)
Top Overlay:
  circle w0.254: c0,0 r10.5
  lines w0.254: -19.82,-0.051 ccw(c-15.22,-0.051) -17.773,-3.877 -7.246,-10.902 ccw(c-0.03,-0.089) -0.03,-13.089 -0.02,-13.089 ccw(c-0.02,-0.089) 7.196,-10.902 17.723,-3.877 ccw(c15.17,-0.051) 19.77,-0.051 19.77,0.051 ccw(c15.17,0.051) 17.723,3.877 7.196,10.902 ccw(c-0.02,0.089) -0.02,13.089 -0.03,13.089 ccw(c-0.03,0.089) -7.246,10.902 -17.773,3.877 ccw(c-15.22,0.051) -19.82,0.051 -19.82,-0.051
3D body "User Library-TO-3_Long.STEP": height 8.5, standoff -12, extent -19.757,-13.089 19.833,13.089

## TO3-5 [mm]
pads (5):
  rect 2.2x2.2 hole 1.4: 1(0,0)
  round 2.2 hole 1.4: 2(3.81,0) 3(6.35,0) 4(8.89,0) 5(11.43,0)
Top Overlay:
  circle w0.4: c-2.8,0 r0.2
  lines w0.254: -2.085,2.6 13.515,2.6 ; -2.085,-1.65 -2.085,3.15 13.515,3.15 13.515,-1.65 -2.085,-1.65

## TO3A [mm]
pads (3):
  rect 3x2.5 hole 1.6: 1(-5.45,0)
  oval 3x2.5 hole 1.6: 2(0,0) 3(5.45,0)
Top Overlay:
  circle w0.4: c-5.4,-2.1 r0.2
  lines w0.254: -7.8,1.7 7.8,1.7 ; -7.8,-2.8 -7.8,2.2 7.8,2.2 7.8,-2.8 -7.8,-2.8
3D body "TO-3P.STEP": height 24.4, standoff -15.5, extent -7.9,-2.9 7.7,1.81

## TO39 [mm]
pads (3):
  round 1.5 hole 0.7 mask+0.051: 1(-2.5,0) 2(0,-2.5)
  rect 1.5x1.5 hole 0.7 mask+0.051: 3(2.5,0)
Top Overlay:
  circle w0.254: c0,0 r4.75
  lines w0.254: -3.63,3.06 -4.17,3.61 -3.61,4.17 -3.06,3.63
Mechanical 13:
  circle w0.254: c0,0 r4.75
  lines w0.254: -3.63,3.06 -4.17,3.61 -3.61,4.17 -3.06,3.63

## TO52 [mm]
pads (3):
  round 1.2 hole 0.7 mask+0.051: 1(0,-1.27) 2(1.27,0)
  rect 1.2x1.2 hole 0.7 mask+0.051: 3(0,1.27)
Top Overlay:
  circle w0.254: c0,0 r2.92
  lines w0.254: -2.44,-1.6 -3.34,-2.49 -2.49,-3.34 -1.6,-2.44
Mechanical 13:
  circle w0.254: c0,0 r2.92
  lines w0.254: -2.44,-1.6 -3.34,-2.49 -2.49,-3.34 -1.6,-2.44

## TO92-2 [mm]
pads (2):
  rect 1.35x1.35 hole 0.8: 1(-1.27,0)
  round 1.35 hole 0.8: 2(1.27,0)
Top Overlay:
  lines w0.254: -2.097,1.049 cw(c0,0) 2.097,1.049 ; -1.919,-1.348 1.919,-1.348
Mechanical 13:
  lines w0.1: 1.919,-1.348 -1.919,-1.348 cw(c0,0) 1.92,-1.347
3D body: height 6.6, standoff 1.27, extent -2.352,-1.347 2.344,2.354
3D body: height 1.27, standoff -11.43, extent -1.505,-0.192 -1.035,0.192
3D body: height 1.27, standoff -11.43, extent 1.035,-0.192 1.505,0.192

## TO92A [mm]
pads (3):
  rect 2x1.2 hole 0.8: 1(0,-1.8)
  oval 2x1.2 hole 0.8: 2(0,0) 3(0,1.8)
Top Overlay:
  lines w0.2: 1.601,-2.049 cw(c0,0) 1.601,2.049 ; 1.6,-1.99 1.6,1.99
3D body "TO92A.STEP": height 6.33, standoff -4.27, extent -2.286,-2.3 1.314,2.3

## TO92B [mil] "92晶体管"
pads (3):
  oct 50x50 hole 30: 1(-50,-50)
  round 50 hole 30: 2(0,0) 3(50,-50)
Top Overlay:
  lines w8: -90,-90 -90,-10 -40,40 40,40 90,-10 90,-90 -90,-90
3D body "TO92B.STEP": height 283.41, standoff -133.91, extent -90.55,-100 90.55,41.54

## TO92C [mm]
pads (3):
  oval 1x2 hole 0.7 mask+0.051: 1(-1.27,0) 2(0,0) 3(1.27,0)
Top Overlay:
  lines w0.254: -1.98,-1.5 cw(c0,0) 1.98,-1.5 -1.98,-1.5
Mechanical 13:
  lines w0.1: -1.98,-1.5 cw(c0,0) 1.98,-1.5 -1.98,-1.5
3D body "TO-92.STEP": height 8, standoff -5, extent -2.613,-1.6 2.613,2.604

## TO92D [mm]
pads (3):
  oval 1x1.5 hole 0.7 mask+0.051: 1(-1.27,0) 2(0,0) 3(1.27,0)
Top Overlay:
  lines w0.2: -2.5,-1.2 -2.5,0.3 -1.8,1.2 1.8,1.2 2.5,0.3 2.5,-1.2 -2.5,-1.2
Mechanical 13:
  lines w0.1: -2.6,-1.3 2.6,-1.3 2.6,0.3 1.9,1.3 -1.9,1.3 -2.6,0.3 -2.6,-1.3

## TO92E [mm]
pads (3):
  oval 1.1x2 hole 0.8: 1(-1.5,0) 2(0,0) 3(1.5,0)
Top Overlay:
  lines w0.254: -2.457,-1.721 cw(c0,0) 2.457,-1.721 ; -2.4,-1.75 2.4,-1.75

## TO92F [mm]
pads (3):
  oval 1.2x2 hole 0.8: 1(-2.54,0) 2(0,0) 3(2.54,0)
Top Overlay:
  lines w0.254: -2.035,1.425 cw(c0,0) 2.035,1.425 ; -1.98,-1.5 1.98,-1.5
Mechanical 13:
  lines w0.1: -1.98,-1.5 cw(c0,0) 1.98,-1.5 -1.98,-1.5

## TO92G [mm]
pads (3):
  oval 1.2x2 hole 0.8: 1(-2.54,0.387) 2(0,1.619) 3(2.54,0.387)
Top Overlay:
  lines w0.254: -2.753,1.976 cw(c-0.029,-0.31) 2.695,1.976 ; -2.6,-1.2 2.5,-1.2
3D body "User Library-TO-92-5.STEP": height 7.14, standoff -0.9, extent -2.84,-1.1 2.84,2.7

## TO92UA_A [mm] "92晶体管"
height 5.33
pads (3):
  rect 1.5x1.3 hole 0.7: 1(0,-1.8)
  oval 1.5x1.3 hole 0.7: 2(0,0) 3(0,1.8)
Top Overlay:
  lines w0.2: 1.27,-2.032 1.27,2.032
  lines w0.203: 1.27,-2.032 0.508,-2.794 -1.016,-2.794 -1.016,2.794 0.508,2.794 1.27,2.032
3D body "TO92UA_A.STEP": height 4.73, standoff -4.27, extent -0.635,-2.05 0.915,2.05

## TO126 [mm] "126晶体管"
pads (3):
  rect 2x2 hole 1.1: 1(0,2.3)
  round 2 hole 1.1: 2(0,0) 3(0,-2.3)
Top Overlay:
  lines w0.2: 1.041,-3.734 1.041,3.734 ; -1.268,-3.005 -1.268,2.964 -0.48,3.752 1.295,3.752 1.295,-3.767 -0.506,-3.767 -1.268,-3.005
3D body "TO126.STEP": height 15, standoff -4, extent -1.268,-4.02 1.532,3.98